# Altium footprint library main.PcbLib: 217 footprints (part 7 of 14)
Each footprint in its own frame and in the unit in brackets; x right, y up, seen from the top. Pads: shape width x height; smd on the part's side, far side on the other; paste and mask are expansions set on the pad; w line width, h text height; cw(c..) or ccw(c..) is an arc to the next point about the centre after c.
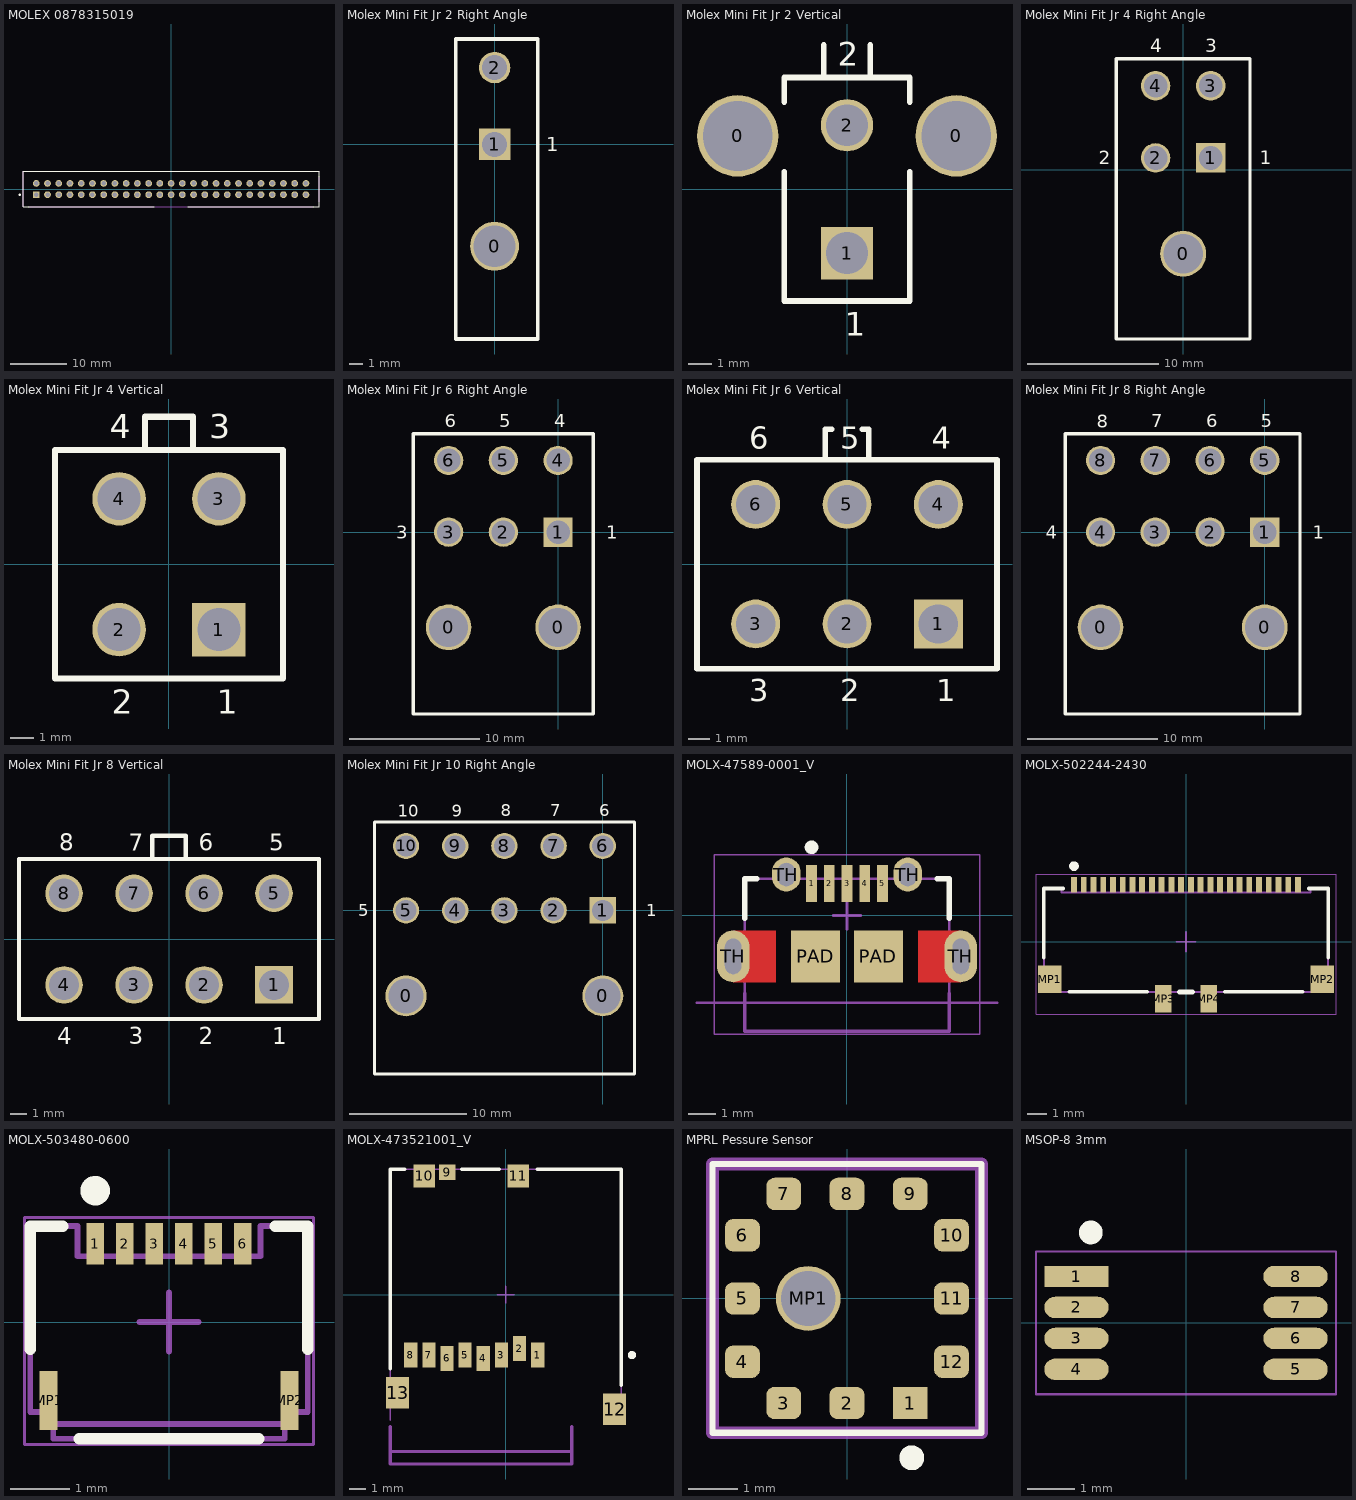
[diagram p6: the footprints below, top view; thin cyan lines are the x and y axes]

## MOLEX 0878315019 [mm] "MOLEX  0878315019"
height 5.4
pads (50):
  rect 1.2x1.2 hole 0.8 paste-1000 mask+0: 1(-24,-1)
  round 1.2 hole 0.8 paste-1000 mask+0: 2(-24,1) 3(-22,-1) 4(-22,1) 5(-20,-1) 6(-20,1) 7(-18,-1) 8(-18,1) 9(-16,-1) 10(-16,1) 11(-14,-1) 12(-14,1) 13(-12,-1) 14(-12,1) 15(-10,-1) 16(-10,1) 17(-8,-1) 18(-8,1) 19(-6,-1) 20(-6,1) 21(-4,-1) 22(-4,1) 23(-2,-1) 24(-2,1) 25(0,-1) 26(0,1) 27(2,-1) 28(2,1) 29(4,-1) 30(4,1) 31(6,-1) 32(6,1) 33(8,-1) 34(8,1) 35(10,-1) 36(10,1) 37(12,-1) 38(12,1) 39(14,-1) 40(14,1) 41(16,-1) 42(16,1) 43(18,-1) 44(18,1) 45(20,-1) 46(20,1) 47(22,-1) 48(22,1) 49(24,-1) 50(24,1)
Top Overlay:
  circle w0.25: c-26.95,-1.025 r0.125
  lines w0.2: -3,-3.15 -26.325,-3.15 -26.325,3.15 26.325,3.15 26.325,-3.15 3,-3.15
Mechanical 7:
  text ".Designator" at -12.94,-1.63 h1.52
Mechanical 13:
  lines w0.2: -26.325,-3.15 -26.325,3.15 26.325,3.15 ; -25.325,-3.15 25.325,-3.15 ; 26.325,-2.275 26.325,2.125
Mechanical 15:
  lines w0.2: -26.325,-3.15 -26.325,3.146 26.325,3.157 ; -25.325,-3.15 25.325,-3.15 ; 26.325,-2.225 26.325,2.183
3D body "878315019.stp": height 6.45, standoff -2.45, extent -26.325,-3.15 26.325,3.15

## Molex Mini Fit Jr 2 Right Angle [mm] "Molex Mini Fit Jr 2 Right Angle"
height 12.8
pads (3):
  round 3.5 hole 3: 0(0,-7.3)
  rect 2.25x2.25 hole 1.8: 1(0,0)
  round 2.25 hole 1.8: 2(0,5.5)
Top Overlay:
  lines w0.254: -2.8,-13.95 3.1,-13.95 3.1,7.55 -2.8,7.55 -2.8,-13.95
  text "1" at 3.7,-0.5 h1.02
3D body "026013114.stp": height 11.4, standoff -3.6, extent -2.7,-13.967 3.1,5.967

## Molex Mini Fit Jr 2 Vertical [mm] "Molex Mini Fit Jr 2 Vertical"
height 12.8
pads (4):
  round 3.5 hole 3: 0(-4.7,2.29) 0(4.7,2.29)
  rect 2.25x2.25 hole 1.8: 1(0,-2.75)
  round 2.25 hole 1.8: 2(0,2.75)
Top Overlay:
  lines w0.254: -2.7,0.75 -2.7,-4.8 2.7,-4.8 2.7,0.75 ; -2.7,3.75 -2.7,4.8 2.7,4.8 2.7,3.75 ; -1,4.85 -1,6.2 ; 1,4.85 1,6.2
  text "2" at -0.4,5.3 h1.02
  text "1" at -0.1,-6.3 h1.02
3D body "039299025.stp": height 12.8, standoff -3.5, extent -6.089,-5.05 6.089,5.95

## Molex Mini Fit Jr 4 Right Angle [mm] "Molex Mini Fit Jr 4 Right Angle"
height 12.8
pads (5):
  round 3.5 hole 3: 0(0,-6.4)
  rect 2.25x2.25 hole 1.8: 1(2.1,0.9)
  round 2.25 hole 1.8: 2(-2.1,0.9) 3(2.1,6.4) 4(-2.1,6.4)
Top Overlay:
  lines w0.254: -5.1,-12.9 -5.1,8.45 5.1,8.45 5.1,-12.9 -5.1,-12.9
  text "1" at 5.85,0.41 h1.02
  text "2" at -6.43,0.41 h1.02
  text "3" at 1.7,8.95 h1.02
  text "4" at -2.5,8.95 h1.02
3D body "039301042.stp": height 11.4, standoff -3.6, extent -4.8,-13.035 5.2,6.9

## Molex Mini Fit Jr 4 Vertical [mm] "Molex Mini Fit Jr 4 Vertical"
height 12.8
pads (4):
  rect 2.25x2.25 hole 1.8: 1(2.1,-2.75)
  round 2.25 hole 1.8: 2(-2.1,-2.75) 3(2.1,2.75) 4(-2.1,2.75)
Top Overlay:
  lines w0.254: -1,4.85 -1,6.2 1,6.2 1,4.85 ; -4.8,-4.8 4.8,-4.8 4.8,4.8 -4.8,4.8 -4.8,-4.8
  text "4" at -2.5,5.3 h1.02
  text "3" at 1.7,5.3 h1.02
  text "2" at -2.4,-6.3 h1.02
  text "1" at 2,-6.3 h1.02
3D body "039293046.stp": height 12.8, standoff -3.5, extent -5.2,-4.9 5.2,6.1

## Molex Mini Fit Jr 6 Right Angle [mm] "Molex Mini Fit Jr 6 Right angle"
height 12.8
pads (8):
  round 3.5 hole 3: 0(-8.4,-7.3) 0(0,-7.3)
  rect 2.25x2.25 hole 1.8: 1(0,0)
  round 2.25 hole 1.8: 2(-4.2,0) 3(-8.4,0) 4(0,5.5) 5(-4.2,5.5) 6(-8.4,5.5)
Top Overlay:
  lines w0.254: -11.1,-13.95 -11.1,7.55 2.7,7.55 2.7,-13.95 -11.1,-13.95
  text "1" at 3.7,-0.5 h1.02
  text "4" at -0.3,8.05 h1.02
  text "5" at -4.5,8.05 h1.02
  text "6" at -8.7,8.05 h1.02
  text "3" at -12.4,-0.5 h1.02
3D body "039301062.stp": height 11.4, standoff -3.6, extent -11.1,-13.867 3.1,6.067

## Molex Mini Fit Jr 6 Vertical [mm] "Molex Mini Fit Jr 6 Vertical"
height 12.8
pads (6):
  rect 2.25x2.25 hole 1.8: 1(4.2,-2.75)
  round 2.25 hole 1.8: 2(0,-2.75) 3(-4.2,-2.75) 4(4.2,2.75) 5(0,2.75) 6(-4.2,2.75)
Top Overlay:
  lines w0.254: -1,4.85 -1,6.2 -0.7,6.2 ; 0.7,6.2 1,6.2 1,4.85 ; -6.9,-4.8 -6.9,4.8 6.9,4.8 6.9,-4.8 -6.9,-4.8
  text "1" at 4.1,-6.3 h1.02
  text "2" at -0.3,-6.3 h1.02
  text "4" at 3.9,5.3 h1.02
  text "5" at -0.3,5.3 h1.02
  text "6" at -4.5,5.3 h1.02
  text "3" at -4.5,-6.3 h1.02
3D body "039293066.stp": height 12.8, standoff -3.5, extent -7.3,-4.9 7.3,6.1

## Molex Mini Fit Jr 8 Right Angle [mm] "Molex Mini Fit Jr 8 Right Angle"
height 12.8
pads (10):
  round 3.5 hole 3: 0(-12.6,-7.3) 0(0,-7.3)
  rect 2.25x2.25 hole 1.8: 1(0,0)
  round 2.25 hole 1.8: 2(-4.2,0) 3(-8.4,0) 4(-12.6,0) 5(0,5.5) 6(-4.2,5.5) 7(-8.4,5.5) 8(-12.6,5.5)
Top Overlay:
  lines w0.254: -15.3,-13.95 2.7,-13.95 2.7,7.55 -15.3,7.55 -15.3,-13.95
  text "7" at -8.7,8.05 h1.02
  text "6" at -4.5,8.05 h1.02
  text "5" at -0.3,8.05 h1.02
  text "1" at 3.7,-0.5 h1.02
  text "4" at -16.8,-0.5 h1.02
  text "8" at -12.9,8 h1.02
3D body "039301081.stp": height 11.4, standoff -3.6, extent -15.3,-13.9 3.1,6.035

## Molex Mini Fit Jr 8 Vertical [mm]
height 12.8
pads (8):
  rect 2.25x2.25 hole 1.8: 1(6.3,-2.75)
  round 2.25 hole 1.8: 2(2.1,-2.75) 3(-2.1,-2.75) 4(-6.3,-2.75) 5(6.3,2.75) 6(2.1,2.75) 7(-2.1,2.75) 8(-6.3,2.75)
Top Overlay:
  lines w0.254: -1,4.85 -1,6.2 1,6.2 1,4.85 ; -9,-4.8 9,-4.8 9,4.8 -9,4.8 -9,-4.8
  text "6" at 1.8,5.3 h1.02
  text "5" at 6,5.3 h1.02
  text "2" at 1.8,-6.3 h1.02
  text "1" at 6.2,-6.3 h1.02
  text "3" at -2.4,-6.3 h1.02
  text "4" at -6.7,-6.3 h1.02
  text "7" at -2.4,5.3 h1.02
  text "8" at -6.6,5.3 h1.02
3D body "039293086.stp": height 12.8, standoff -3.5, extent -9.4,-4.8 9.4,6.2

## Molex Mini Fit Jr 10 Right Angle [mm] "Molex Mini Fit Jr 10 Right Angle"
height 12.8
pads (12):
  round 3.5 hole 3: 0(-16.8,-7.3) 0(0,-7.3)
  rect 2.25x2.25 hole 1.8: 1(0,0)
  round 2.25 hole 1.8: 2(-4.2,0) 3(-8.4,0) 4(-12.6,0) 5(-16.8,0) 6(0,5.5) 7(-4.2,5.5) 8(-8.4,5.5) 9(-12.6,5.5) 10(-16.8,5.5)
Top Overlay:
  lines w0.254: -19.5,-13.95 -19.5,7.55 2.7,7.55 2.7,-13.95 -19.5,-13.95
  text "5" at -20.9,-0.5 h1.02
  text "9" at -12.9,8 h1.02
  text "10" at -17.5,8 h1.02
  text "1" at 3.7,-0.5 h1.02
  text "6" at -0.3,8.05 h1.02
  text "7" at -4.5,8.05 h1.02
  text "8" at -8.7,8.05 h1.02
3D body "039301101.stp": height 11.4, standoff -3.6, extent -19.5,-13.867 3.1,6.067

## MOLX-47589-0001_V [mm] "SMD, 5-Leads, Body 7.5x5.6mm, Pitch 0.65mm"
height 2.65
pads (11):
  rect 0.4x1.35 smd: 1(-1.3,1.175) 2(-0.65,1.175) 3(0,1.175) 4(0.65,1.175) 5(1.3,1.175)
  rect 1.8x1.9 smd: PAD(-1.15,-1.5) PAD(1.15,-1.5)
  oval 1.2x1.9 hole 0.6 slot 1.3 at 90 deg: TH(-4.175,-1.5) TH(4.175,-1.5)
  oval 1.05x1.25 hole 0.65 slot 0.85 at 90 deg: TH(-2.225,1.5) TH(2.225,1.5)
Top Layer:
  rectangle: 2.6,-2.45 4.175,-0.55
  region: -2.6,-0.55 -4.175,-0.55 -4.175,-2.45 -2.6,-2.45
Top Overlay:
  circle w0.25: c-1.3,2.5 r0.125
  lines w0.2: -3.75,-0.1 -3.75,1.35 -3.3,1.35 ; 3.3,1.35 3.75,1.35 3.75,-0.1
Mechanical 5:
  lines w0.1: -5.5,-3.2 5.5,-3.2
  lines w0.127: -3.75,-2.85 -3.75,-4.25 3.75,-4.25 3.75,-2.85
  text "PCB EDGE" at 5.7,-2.5 h1
Mechanical 7:
  text ".Designator" at -2.086,-2.302 h1.52
Mechanical 13:
  lines w0.1: -3.75,-4.25 3.75,-4.25 3.75,1.35 -3.75,1.35 -3.75,-4.25
Mechanical 15:
  lines w0.05: -4.875,-4.35 -4.875,2.225 4.875,2.225 4.875,-4.35 -4.875,-4.35
  lines w0.1: -0.5,0 0.5,0 ; 0,-0.5 0,0.5
3D body "475890001.stp": height 2.74, standoff -0.57, extent -4.325,-4.25 4.325,1.644

## MOLX-502244-2430 [mm] "FFC Connector, 24-Leads, Right Angle, Pitch 0.5 mm, Mated Height 2.33 mm, SMT"
height 2.342
pads (28):
  rect 0.3x0.8 smd: 1(-5.75,2.93) 2(-5.25,2.93) 3(-4.75,2.93) 4(-4.25,2.93) 5(-3.75,2.93) 6(-3.25,2.93) 7(-2.75,2.93) 8(-2.25,2.93) 9(-1.75,2.93) 10(-1.25,2.93) 11(-0.75,2.93) 12(-0.25,2.93) 13(0.25,2.93) 14(0.75,2.93) 15(1.25,2.93) 16(1.75,2.93) 17(2.25,2.93) 18(2.75,2.93) 19(3.25,2.93) 20(3.75,2.93) 21(4.25,2.93) 22(4.75,2.93) 23(5.25,2.93) 24(5.75,2.93)
  rect 1.22x1.4 smd: MP1(-6.99,-1.92) MP2(6.99,-1.92)
  rect 0.85x1.4 smd: MP3(-1.175,-2.93) MP4(1.175,-2.93)
Top Overlay:
  circle w0.25: c-5.75,3.88 r0.125
  lines w0.2: -7.3,-0.82 -7.3,2.73 -6.3,2.73 ; -5.98,-2.57 -2,-2.57 ; 2,-2.57 5.98,-2.57 ; 6.3,2.73 7.3,2.73 7.3,-0.82
  lines w0.254: -0.323,-2.57 0.323,-2.57
Mechanical 7:
  text ".Designator" at -3.746,-0.489 h1.52
Mechanical 13:
  lines w0.1: -7.3,-2.57 7.3,-2.57 7.3,2.73 6.4,2.73 6.4,2.53 -6.4,2.53 -6.4,2.73 -7.3,2.73 -7.3,-2.57
Mechanical 15:
  lines w0.05: -7.7,-3.725 7.7,-3.725 7.7,3.455 -7.7,3.455 -7.7,-3.725
  lines w0.1: -0.5,0 0.5,0 ; 0,-0.5 0,0.5
3D body "5022442430.stp": height 2.34, standoff 0.01, extent -7.3,-3.43 7.3,3.03

## MOLX-503480-0600 [mm] "FPC Connector, 6-Leads, Right Angle, Pitch 0.5 mm, Mated Height 1.0 mm, SMT"
height 1.907
pads (8):
  rect 0.3x0.7 smd: 1(-1.25,1.325) 2(-0.75,1.325) 3(-0.25,1.325) 4(0.25,1.325) 5(0.75,1.325) 6(1.25,1.325)
  rect 0.3x1 smd: MP1(-2.04,-1.325) MP2(2.04,-1.325)
Top Overlay:
  circle w0.25: c-1.25,2.225 r0.125
  lines w0.2: -2.35,-0.458 -2.35,1.625 -1.8,1.625 ; -1.519,-1.975 1.519,-1.975 ; 1.8,1.625 2.35,1.625 2.35,-0.458
Mechanical 7:
  text ".Designator" at -3.5,-0.9 h1.52
Mechanical 13:
  lines w0.1: -1.96,-1.725 1.96,-1.725 ; -2.35,-1.525 -2.35,1.625 -1.55,1.625 -1.55,1.115 1.55,1.115 1.55,1.625 2.35,1.625 2.35,-1.525 1.96,-1.525 1.96,-1.975 -1.96,-1.975 -1.96,-1.525 -2.35,-1.525
Mechanical 15:
  lines w0.05: -2.45,-2.075 2.45,-2.075 2.45,1.775 -2.45,1.775 -2.45,-2.075
  lines w0.1: -0.5,0 0.5,0 ; 0,-0.5 0,0.5
3D body "5034800600.stp": height 1.91, standoff 0.01, extent -2.35,-1.975 2.35,1.625

## MOLX-473521001_V [mm] "SMD, 8-Leads, Body 15.2x14mm, Pitch 1.1mm"
height 1.88
pads (13):
  rect 0.8x1.5 smd: 1(1.94,-3.66) 2(0.84,-3.26) 3(-0.26,-3.66) 4(-1.36,-3.86) 5(-2.46,-3.66) 6(-3.56,-3.86) 7(-4.66,-3.66) 8(-5.76,-3.66)
  rect 1x0.95 smd: 9(-3.56,7.425)
  rect 1.3x1.4 smd: 10(-4.95,7.2) 11(0.75,7.2)
  rect 1.4x1.9 smd: 12(6.6,-6.95) 13(-6.55,-5.95)
Top Overlay:
  circle w0.25: c7.65,-3.66 r0.125
  lines w0.2: -7,-4.5 -7,7.6 -6.1,7.6 ; -2.66,7.6 -0.4,7.6 ; 1.9,7.6 7,7.6 7,-5.5
Mechanical 5:
  lines w0.2: -7,-9.5 4,-9.5 ; -7,-8 -7,-10.26 4,-10.26 4,-8
  text "Must tent vias / under carrier / on pad layer" at -5.4,-1 h2
  text "Fully inserted" at -5.2,-9.3 h1.5
  text "Working position" at -6.2,-11.9 h1.5
Mechanical 7:
  text ".Designator" at -6.669,-0.279 h1.52
Mechanical 13:
  lines w0.1: -7,-7.6 -7,7.6 7,7.6 7,-7.6
Mechanical 15:
  lines w0.1: -0.5,0 0.5,0 ; 0,-0.5 0,0.5
3D body "473521001.stp": height 1.85, standoff -0.03, extent -7.05,-7.6 7.05,7.6

## MPRL Pessure Sensor [mm] "MPRL Pessure Sensor"
pads (13):
  rect 0.7x0.65 smd mask+0.076: 1(1.27,-2.1)
  rrect50% 0.7x0.65 smd mask+0.076: 2(0,-2.1) 3(-1.27,-2.1) 4(-2.1,-1.27) 5(-2.1,0) 6(-2.1,1.27) 7(-1.27,2.1) 8(0,2.1) 9(1.27,2.1) 10(2.1,1.27) 11(2.1,0) 12(2.1,-1.27)
  round 1.3 hole 1.1: MP1(-0.78,0)
Top Overlay:
  circle w0.25: c1.3,-3.2 r0.125
  lines w0.127: -2.7,-2.7 -2.7,2.7 2.7,2.7 2.7,-2.7 -2.7,-2.7
Mechanical 7:
  text ".Designator" at -0.9,-1.1 h1.52
Mechanical 15:
  lines w0.254: -2.7,-2.7 2.7,-2.7 2.7,2.7 -2.7,2.7 -2.7,-2.7
3D body: height 2.55, standoff -2.55, extent -0.75,3.5 -0.75,3.5
3D body: height 0.6, standoff 0, extent -2.5,-2.5 2.5,2.5
3D body: height 2.76, standoff 0, extent -2,-2 2,2
3D body: height 5.86, standoff 0, extent -1.24,-1.247 1.25,1.248

## MSOP-8 3mm [mm] "MSOP-8 3mm"
height 1
pads (8):
  rect 1.35x0.45 smd mask+0.05: 1(-2.3,0.975)
  oval 1.35x0.45 smd mask+0.05: 2(-2.3,0.325) 3(-2.3,-0.325) 4(-2.3,-0.975) 5(2.3,-0.975) 6(2.3,-0.325) 7(2.3,0.325) 8(2.3,0.975)
Top Overlay:
  circle w0.25: c-2,1.9 r0.125
Mechanical 15:
  lines w0.05: -3.15,-1.5 -3.15,1.5 3.15,1.5 3.15,-1.5 -3.15,-1.5
3D body "User Library-EMSOP-8 Natl Semi MUY08A.step": height 1.09, standoff -0.01, extent -2.5,-1.5 2.5,1.5